# Altium footprint library mastermind.PCBLIB: 1061 footprints (part 26 of 67)
Each footprint in its own frame and in the unit in brackets; x right, y up, seen from the top. Pads: shape width x height; smd on the part's side, far side on the other; paste and mask are expansions set on the pad; w line width, h text height; cw(c..) or ccw(c..) is an arc to the next point about the centre after c.
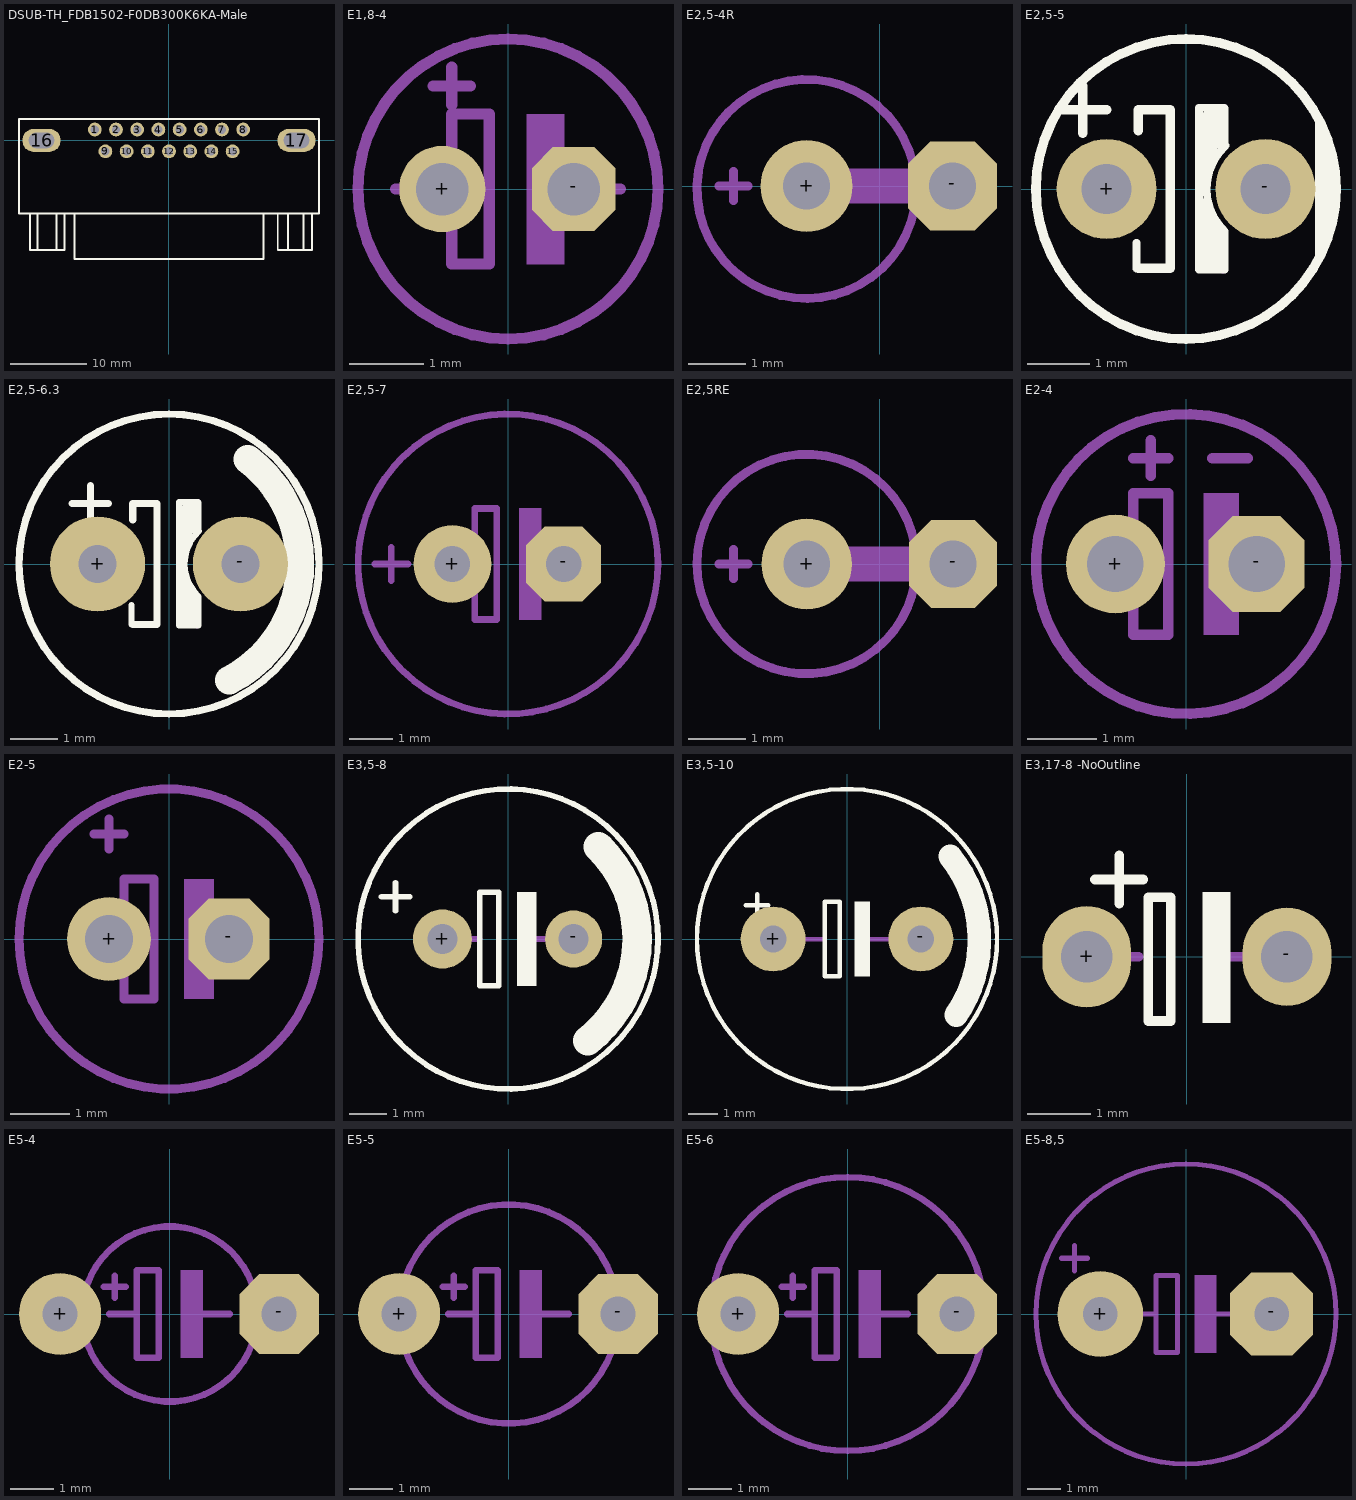
[diagram p25: the footprints below, top view; thin cyan lines are the x and y axes]

## DSUB-TH_FDB1502-F0DB300K6KA-Male [mm]
pads (17):
  round 1.8 hole 1.1: 1(-9.695,1.42) 2(-6.925,1.42) 3(-4.155,1.42) 4(-1.385,1.42) 5(1.385,1.42) 6(4.155,1.42) 7(6.925,1.42) 8(9.695,1.42) 9(-8.31,-1.42) 10(-5.54,-1.42) 11(-2.77,-1.42) 12(0,-1.42) 13(2.77,-1.42) 14(5.54,-1.42) 15(8.31,-1.42)
  oval 5x3.048 hole 2.032 slot 3.3 at 0 deg: 16(-16.66,0) 17(16.66,0)
Top Overlay:
  lines w0.254: -18.153,-9.52 -18.153,-14.32 -13.653,-14.32 -13.653,-9.52 ; -17.162,-14.32 -17.162,-9.52 ; -14.672,-14.32 -14.672,-9.52 ; -12.33,-9.52 -12.33,-15.52 12.33,-15.52 12.33,-9.52 ; 14.211,-9.52 14.211,-14.32 18.711,-14.32 18.711,-9.52 ; 15.521,-14.32 15.521,-9.52 ; 17.579,-14.32 17.579,-9.52 ; -19.6,-9.52 19.6,-9.52 19.6,2.83 -19.6,2.83 -19.6,-9.52

## E1,8-4 [mil]
pads (2):
  round 46 hole 28: +(-35,0)
  oct 44.54x44.54 hole 28: -(35,0)
Mechanical 2:
  circle w6: c0,0 r80
  lines w6: -40,55 -20,55 ; -30,45 -30,65
Mechanical 8:
  region: 10,-40 10,40 30,40 30,-40
  lines w6: -60,0 -30,0 ; 25,0 60,0 ; -30,0 -30,-40 -10,-40 -10,40 -30,40 -30,0

## E2,5-4R [mil]
pads (2):
  round 63 hole 32: +(-50,0)
  oct 61x61 hole 32: -(50,0)
Mechanical 2:
  lines w6: -110,0 -90,0 ; -100,-10 -100,10 ; 20,25 ccw(c-50,-1.99) 21.27,-25.42
  lines w24: -5,0 3,0
Mechanical 8:
  lines w6: 20,25 cw(c-50,-1.99) 21.27,-25.42
  lines w24: -50,0 50,0

## E2,5-5 [mm]
pads (2):
  round 1.6 hole 0.8: +(-1.27,0) -(1.27,0)
Top Overlay:
  circle w0.152: c0,0 r2.4
  region: 2.07,1.215 2.07,-1.215 2.301,-0.681 2.396,0.139 2.212,0.93 2.085,1.188
  lines w0.127: -0.79,-0.86 -0.79,-1.27 -0.762,-1.27 ; 0.21,1.29 0.21,-1.29 0.59,-1.29 ; 0.21,1.3 0.61,1.3 ; 0.28,-0.217 0.308,-0.217 0.308,-1.29 0.424,-1.29 0.424,-0.453 0.435,-0.453 0.435,-0.707 0.534,-0.707 0.534,-1.29 ; 0.296,0.139 0.328,0.139 0.328,1.188 0.488,1.188 0.429,1.188 ; 0.62,0.71 0.62,1.29 ; 0.62,-1.29 0.62,-0.681 cw(c1.27,0) 0.634,0.694 ; 0.429,1.188 0.53,1.188 0.53,0.71 0.429,0.71 0.429,0.517 0.429,1.188
  lines w0.152: -2.032,1.27 -1.651,1.27 ; -1.651,0.889 -1.651,1.27 ; -1.651,1.651 -1.651,1.27 ; -1.27,1.27 -1.651,1.27 ; -0.762,-1.27 -0.254,-1.27 -0.254,1.27 -0.762,1.27 -0.762,0.93
Mechanical 8:
  lines w0.127: 0.59,-1.29 0.59,-1.27 ; 0.61,1.27 0.61,1.3
  lines w0.152: -1.651,0 -0.762,0 ; 0.635,0 1.651,0
3D body "CircuitWorks-ELECTROLITIC CAPACITOR RADIAL 5X11.step": height 11, standoff -2.5, extent -2.435,-2.457 2.565,2.543

## E2,5-6.3 [mm]
pads (2):
  round 2 hole 0.8: +(-1.5,0) -(1.5,0)
Top Overlay:
  circle w0.152: c0,0 r3.15
  lines w0.127: -0.79,-0.86 -0.79,-1.27 -0.762,-1.27 ; 0.21,1.29 0.21,-1.29 0.59,-1.29 ; 0.21,1.3 0.61,1.3 ; 0.28,-0.217 0.308,-0.217 0.308,-1.29 0.424,-1.29 0.424,-0.453 0.435,-0.453 0.435,-0.707 0.534,-0.707 0.534,-1.29 ; 0.296,0.139 0.328,0.139 0.328,1.188 0.488,1.188 0.429,1.188 ; 0.62,0.71 0.62,1.29 ; 0.62,-1.29 0.62,-0.681 cw(c1.27,0) 0.634,0.694 ; 0.429,1.188 0.53,1.188 0.53,0.71 0.429,0.71 0.429,0.517 0.429,1.188
  lines w0.152: -2.032,1.27 -1.651,1.27 ; -1.651,0.889 -1.651,1.27 ; -1.651,1.651 -1.651,1.27 ; -1.27,1.27 -1.651,1.27 ; -0.762,-1.27 -0.254,-1.27 -0.254,1.27 -0.762,1.27 -0.762,0.93
  lines w0.6: 1.263,-2.443 ccw(c0,0) 1.65,2.2
Mechanical 8:
  lines w0.127: 0.59,-1.29 0.59,-1.27 ; 0.61,1.27 0.61,1.3
  lines w0.152: -1.651,0 -0.762,0 ; 0.635,0 1.651,0
3D body "CircuitWorks-ELECTROLITIC CAPACITOR RADIAL 5X11.step": height 11, standoff -2.5, extent -2.435,-2.457 2.565,2.543

## E2,5-7 [mil]
pads (2):
  round 70 hole 32: +(-50,0)
  oct 67.78x67.78 hole 32: -(50,0)
Mechanical 2:
  circle w6: c0,0 r135
  lines w6: -120,0 -90,0 ; -105,-15 -105,15
Mechanical 8:
  region: 10,-50 10,50 30,50 30,-50
  lines w6: -65,0 -30,0 ; 25,0 65,0 ; -30,0 -30,-50 -10,-50 -10,50 -30,50 -30,0

## E2,5RE [mil]
pads (2):
  round 62 hole 32: +(-50,0)
  oct 60.03x60.03 hole 32: -(50,0)
Mechanical 2:
  lines w6: -110,0 -90,0 ; -100,-10 -100,10 ; 10,-45 cw(c-50,0) 10,45
  lines w24: -5,0 3,0
Mechanical 8:
  lines w6: 10,-45 ccw(c-50,0) 10,45
  lines w24: -50,0 50,0

## E2-4 [mil]
pads (2):
  round 56 hole 32: +(-40,0)
  oct 54.22x54.22 hole 32: -(40,0)
Mechanical 2:
  circle w6: c0,0 r85
  lines w6: -30,60 -10,60 ; -20,50 -20,70 ; 15,60 35,60
Mechanical 8:
  region: 10,-40 10,40 30,40 30,-40
  lines w6: -60,0 -30,0 ; 25,0 60,0 ; -30,0 -30,40 -10,40 -10,-40 -30,-40 -30,0

## E2-5 [mil]
pads (2):
  round 56 hole 32: +(-40,0)
  oct 54.22x54.22 hole 32: -(40,0)
Mechanical 2:
  circle w6: c0,0 r100
  lines w6: -50,70 -30,70 ; -40,60 -40,80
Mechanical 8:
  region: 10,-40 10,40 30,40 30,-40
  lines w6: -60,0 -30,0 ; 25,0 60,0 ; -30,0 -30,40 -10,40 -10,-40 -30,-40 -30,0

## E3,5-8 [mil]
pads (2):
  round 63 hole 32: +(-70,0)
  round 61 hole 32: -(70,0)
Top Overlay:
  circle w6: c0,0 r160
  region: 10,-50 10,50 30,50 30,-50
  lines w6: -135,45 -105,45 ; -120,30 -120,60 ; -30,-50 -30,0 -30,50 -10,50 -10,-50 -30,-50
  lines w31.5: 85.1,-108.31 ccw(c0,0) 96.5,98.29
Mechanical 8:
  lines w6: -65,0 -30,0 ; 25,0 65,0
3D body "CircuitWorks-ELECTROLITIC CAPACITOR RADIAL 8X12.step": height 472.44, standoff -98.43, extent -157.48,-157.43 157.48,157.53

## E3,5-10 [mm]
pads (2):
  round 2.2 hole 0.9: +(-2.5,0) -(2.5,0)
Top Overlay:
  circle w0.152: c0,0 r5.08
  region: 0.254,-1.27 0.254,1.27 0.762,1.27 0.762,-1.27
  lines w0.152: -3.429,1.143 -2.667,1.143 ; -3.048,0.762 -3.048,1.524 ; -0.762,-1.27 -0.254,-1.27 -0.254,1.27 -0.762,1.27 -0.762,0 -0.762,-1.27
  lines w0.8: 3.492,2.799 cw(c-0.025,-0.025) 3.697,-2.574
Mechanical 8:
  lines w0.152: -1.651,0 -0.762,0 ; 0.635,0 1.651,0
3D body "CircuitWorks-ELECTROLITIC CAPACITOR RADIAL 10X12.step": height 12, standoff -2.5, extent -5.025,-5.025 4.975,4.975

## E3,17-8 -NoOutline [mm]
pads (2):
  oval 1.4x1.6 hole 0.813: +(-1.58,0)
  oval 1.4x1.549 hole 0.813: -(1.58,0)
Top Overlay:
  region: 0.254,-1.041 0.254,1.016 0.686,1.016 0.686,-1.041
  lines w0.152: -1.448,1.219 -0.686,1.219 ; -1.067,0.838 -1.067,1.6 ; -0.61,-1.016 -0.254,-1.016 -0.254,0.94 -0.61,0.94 -0.61,-0.152 -0.61,-1.016
Mechanical 8:
  lines w0.152: -1.651,0 -0.762,0 ; 0.635,0 1.651,0
3D body "cap_el_horizontal_d8_h11.5_pitch3.5_w0.6.stp": height 3, standoff -8.1, extent -4.03,-0.315 3.98,13.295

## E5-4 [mil]
pads (2):
  round 75 hole 32: +(-100,0)
  oct 72.62x72.62 hole 32: -(100,0)
Mechanical 2:
  region: 10,-40 10,40 30,40 30,-40
  lines w6: -66.87,-43.91 ccw(c0,0) 66.87,-43.91 ; -66.87,43.91 cw(c0,0) 66.87,43.91 ; -60,25 -40,25 ; -55,0 -30,0 ; -50,15 -50,35 ; 25,0 55,0 ; -30,0 -30,-40 -10,-40 -10,40 -30,40 -30,0
Mechanical 8:
  lines w6: -66.87,-43.91 cw(c0,0) -66.87,43.91 ; 66.87,-43.91 ccw(c0,0) 66.87,43.91

## E5-5 [mil]
pads (2):
  round 75 hole 32: +(-100,0)
  oct 72.62x72.62 hole 32: -(100,0)
Mechanical 2:
  region: 10,-40 10,40 30,40 30,-40
  lines w6: -84.87,-52.88 ccw(c0,0) 84.87,-52.88 ; -84.87,52.88 cw(c0,0) 84.87,52.88 ; -60,25 -40,25 ; -55,0 -30,0 ; -50,15 -50,35 ; 25,0 55,0 ; -30,0 -30,-40 -10,-40 -10,40 -30,40 -30,0
Mechanical 8:
  lines w6: -84.87,-52.88 cw(c0,0) -84.87,52.88 ; 84.87,-52.88 ccw(c0,0) 84.87,52.88

## E5-6 [mil]
pads (2):
  round 75 hole 32: +(-100,0)
  oct 72.62x72.62 hole 32: -(100,0)
Mechanical 2:
  region: 10,-40 10,40 30,40 30,-40
  lines w6: -113,-53.44 ccw(c0,0) 113,-53.44 ; -113,53.44 cw(c0,0) 113,53.44 ; -60,25 -40,25 ; -55,0 -30,0 ; -50,15 -50,35 ; 25,0 55,0 ; -30,0 -30,40 -10,40 -10,-40 -30,-40 -30,0
Mechanical 8:
  lines w6: -113,-53.44 cw(c0,0) -113,53.44 ; 113,-53.44 ccw(c0,0) 113,53.44

## E5-8,5 [mil]
pads (2):
  round 100 hole 40: +(-100,0)
  oct 96.82x96.82 hole 40: -(100,0)
Mechanical 2:
  circle w6: c0,0 r175
  region: 10,-45 10,45 35,45 35,-45
  lines w6: -145,65 -115,65 ; -130,50 -130,80 ; -45,0 -35,0 ; 25,0 45,0 ; -35,0 -35,45 -10,45 -10,-45 -35,-45 -35,0
Mechanical 8:
  lines w6: -65,0 -45,0 ; 45,0 65,0